# Altium footprint library std-th.PcbLib: 245 footprints (part 15 of 16)
Each footprint in its own frame and in the unit in brackets; x right, y up, seen from the top. Pads: shape width x height; smd on the part's side, far side on the other; paste and mask are expansions set on the pad; w line width, h text height; cw(c..) or ccw(c..) is an arc to the next point about the centre after c.
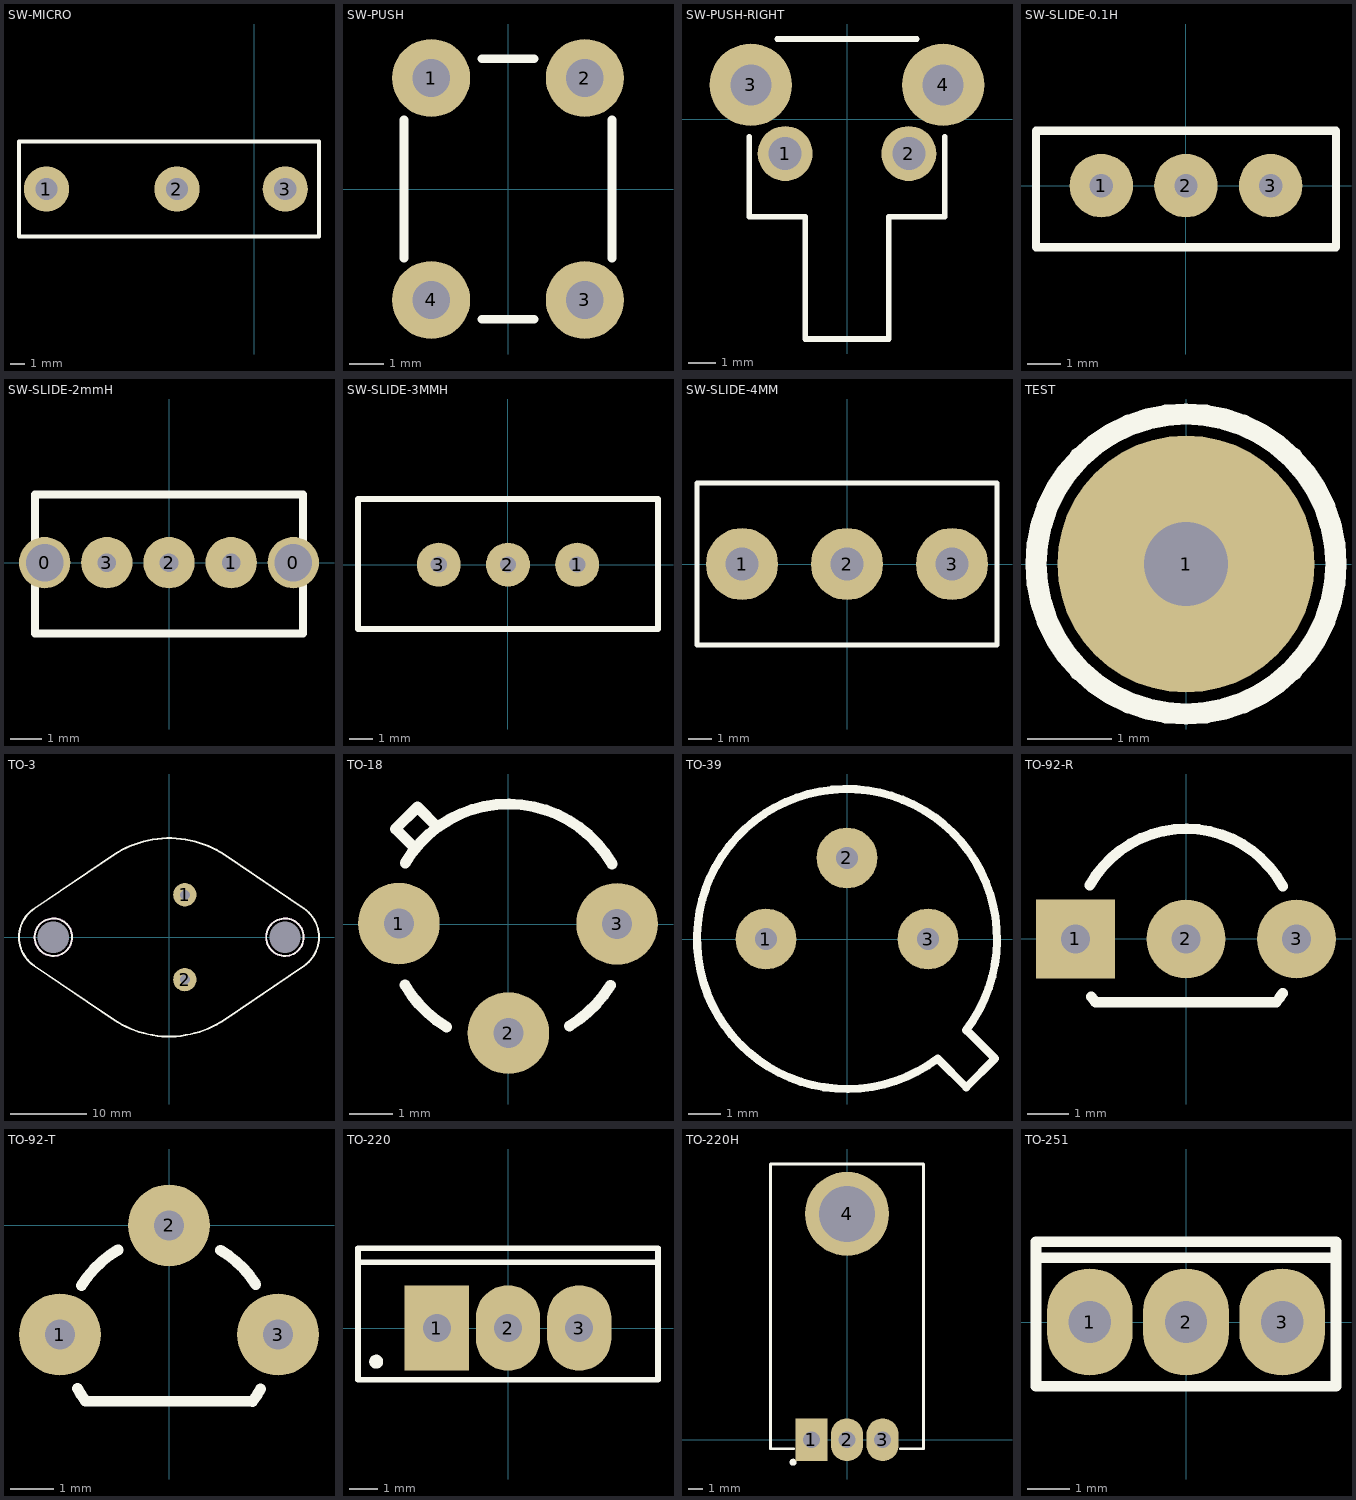
[diagram p14: the footprints below, top view; thin cyan lines are the x and y axes]

## SW-MICRO [mil] "Microswitch, 3 way"
height 472.44
pads (3):
  round 120 hole 59.06: 1(-551.97,500) 2(-205.52,500) 3(81.89,500)
Top Overlay:
  lines w10: -624.8,374.02 171.37,374.02 171.37,625.99 -624.8,625.99 -624.8,374.02
3D body: height 889.76, standoff -145.67, extent -624.8,374.02 171.37,625.99

## SW-PUSH [mm] "Switch, push button, tacticle, 6 x 4 mm"
height 4
pads (4):
  round 2.286 hole 1.1: 1(-2.25,3.25) 2(2.25,3.25) 3(2.25,-3.25) 4(-2.25,-3.25)
Top Overlay:
  lines w0.254: -3.048,-2.032 -3.048,2.032 ; -0.762,-3.81 0.762,-3.81 ; -0.762,3.81 0.762,3.81 ; 3.048,-2.032 3.048,2.032
3D body: height 5.01, standoff -3.51, extent -3.015,-3.871 3.015,3.872

## SW-PUSH-RIGHT [mm] "Push button, right angle"
pads (4):
  round 2 hole 1.2: 1(-2.25,-1.25) 2(2.25,-1.25)
  round 3 hole 1.5: 3(-3.5,1.25) 4(3.5,1.25)
Top Overlay:
  lines w0.203: -3.556,-0.635 -3.556,-3.556 -1.524,-3.556 -1.524,-8.001 1.524,-8.001 1.524,-3.556 3.556,-3.556 3.556,-0.635 ; -2.54,2.921 2.54,2.921
3D body: height 7, standoff -4, extent -3.7,-8.08 3.7,2.92

## SW-SLIDE-0.1H [mm] "Slide Switch, 3 leads, ON-ON, 100 mil pitch"
height 5
pads (3):
  round 1.905 hole 0.7: 1(-2.54,0) 2(0,0) 3(2.54,0)
Top Overlay:
  lines w0.254: -4.499,-1.85 -4.499,1.65 4.5,1.65 4.5,1.65 4.5,-1.85 -4.5,-1.85 ; -4.5,-1.85 -4.499,-1.85
3D body: height 3.5, standoff -2.5, extent -4.499,-4.05 4.5,1.65

## SW-SLIDE-2mmH [mil] "Switch, SPDT, 2 mm pitch"
height 236.22
pads (5):
  round 65 hole 47.24: 0(-157.48,0) 0(157.48,0)
  round 65 hole 23.62: 1(78.74,0) 2(0,0) 3(-78.74,0)
Top Overlay:
  lines w10: -169.49,-90 169.51,-90 169.51,86.51 -169.49,86.51 -169.49,-90
3D body: height 185, standoff -110, extent -169.49,-243.11 169.51,86.51

## SW-SLIDE-3MMH [mm] "Switch, 3 leads, ON-ON, 3 mm pitch"
height 4
pads (3):
  round 1.905 hole 0.7: 1(3,0) 2(0,0) 3(-3,0)
Top Overlay:
  lines w0.254: -6.5,-2.794 6.5,-2.794 6.5,2.85 -6.5,2.85 -6.5,-2.794
3D body: height 6, standoff -2.6, extent -6.5,-9.35 6.5,2.85

## SW-SLIDE-4MM [mil] "Slide switch, 3 leads, 4 mm pitch"
height 521.65
pads (3):
  round 120 hole 55.12: 1(-175,0) 2(0,0) 3(175,0)
Top Overlay:
  lines w8: -250,-135 -250,135 250,135 250,-135 -250,-135
3D body: height 383, standoff -170, extent -216.5,-110 216.5,110

## TEST [mil] "Test Point"
pads (1):
  round 120 hole 39.37: 1(0,0)
Top Overlay:
  circle w10: c0,0 r70

## TO-3 [mm] "TO-3 package"
pads (4):
  round 0 hole 4.1: 0(-15.15,0) 1(15.15,0)
  round 3.048 hole 1.3: 1(2.05,5.55) 2(2.05,-5.55)
Top Overlay:
  circle w0.254: c-15.15,0 r2.45
  circle w0.254: c15.15,0 r2.45
  lines w0.254: -17.675,-3.725 cw(c-15.15,0) -17.675,3.725 -7.294,10.761 cw(c0,-0.257) 7.294,10.761 17.675,3.725 cw(c15.049,0) 17.675,-3.725 7.294,-10.761 cw(c0,0) -7.294,-10.761 -17.675,-3.725
Keep-Out Layer:
  circle w0.254: c-15.15,0 r2.45
  circle w0.254: c15.15,0 r2.45
3D body: height 9.26, standoff -2.64, extent -19.65,-13 19.606,13

## TO-18 [mm] "TO-18 package"
height 15
pads (3):
  round 1.905 hole 0.7: 1(-2.553,0.013) 2(0,-2.54) 3(2.535,0.007)
Top Overlay:
  lines w0.254: -2.412,-1.416 ccw(c0,0) -1.439,-2.399 ; -2.404,1.425 cw(c0,0.013) 2.418,1.4 ; -2.163,1.757 -2.629,2.222 ; -1.65,2.26 -2.121,2.73 ; 1.422,-2.373 ccw(c0,0.013) 2.376,-1.425 ; -2.629,2.222 -2.629,2.222 ; -2.629,2.222 -2.121,2.73 ; -2.121,2.73 -2.121,2.73 ; -2.121,2.73 -2.121,2.73
3D body: height 2.5, standoff -7.41, extent -2.86,-2.834 2.835,2.801

## TO-39 [mm] "TO-39"
height 10
pads (3):
  round 1.905 hole 0.7: 1(-2.54,0) 2(0,2.54) 3(2.54,0)
Top Overlay:
  lines w0.254: 2.842,-3.743 cw(c0,0) 3.73,-2.86 ; 2.866,-3.775 3.737,-4.645 4.635,-3.746 3.739,-2.85
3D body: height 10.6, standoff -7.82, extent -4.7,-4.7 4.687,4.7

## TO-92-R [mm] "TO-92"
height 5
pads (3):
  rect 1.905x1.905 hole 0.7: 1(-2.667,0)
  round 1.905 hole 0.7: 2(0,0) 3(2.667,0)
Top Overlay:
  lines w0.254: -2.324,1.293 cw(c0,0) 2.337,1.27 ; -2.282,-1.394 ccw(c-0.323,0.028) -2.176,-1.53 2.176,-1.53 2.167,-1.522 ; 2.172,-1.526 ccw(c0.323,0.032) 2.338,-1.304
3D body: height 10.33, standoff -7.7, extent -2.888,-1.53 2.852,2.66

## TO-92-T [mm] "TO-92 package"
pads (3):
  round 1.905 hole 0.7: 1(-2.54,-2.54) 2(0,0) 3(2.54,-2.54)
Top Overlay:
  lines w0.203: 1.945,-4.093 1.947,-4.095
  lines w0.254: -2.127,-3.799 ccw(c-0.017,-2.695) -1.945,-4.093 1.945,-4.093 ; -2.033,-1.396 cw(c0,-2.635) -1.181,-0.568 ; 1.198,-0.577 cw(c0,-2.635) 2.019,-1.373 ; 1.947,-4.095 ccw(c0.034,-2.677) 2.132,-3.805
3D body: height 8, standoff -3.02, extent -2.787,-4.091 2.788,0.248

## TO-220 [mil] "TO, Thru-Hole, Vertical, Heatsink Mounted; 3 In-Line Leads; Pitch 2.54 mm"
height 759.84
pads (3):
  rect 90x120 hole 39.37: 1(-100,0)
  oval 90x120 hole 39.37: 2(0,0) 3(100,0)
Top Overlay:
  circle w9.84: c-185.04,-47.24 r4.92
  lines w7.87: -210.63,92.52 210.63,92.52 ; -210.63,-72.83 210.63,-72.83 210.63,112.2 -210.63,112.2 -210.63,-72.83
Mechanical 13:
  lines w3.94: -210.63,-72.83 -210.63,112.2 210.63,112.2 210.63,-72.83 -210.63,-72.83
Mechanical 15:
  lines w3.94: -19.69,0 19.68,0 ; 0,-19.69 0,19.68
3D body: height 748.03, standoff -370.08, extent -204.72,-67.16 204.72,110

## TO-220H [mil] "TO-220AB, 3 leads, 100 mil pitch, horizontal"
height 157.48
pads (4):
  rect 90x120 hole 47.24: 1(-100,0)
  oval 90x120 hole 47.24: 2(0,0) 3(100,0)
  round 236.22 hole 157.48 unplated: 4(0,635)
Top Overlay:
  circle w9.84: c-151.57,-62.99 r4.92
  lines w8: -150,-25 -215,-25 -215,775 215,775 215,-25 150,-25
Mechanical 15:
  lines w3.94: -19.69,0 19.68,0 ; 0,-19.68 0,19.69
3D body: height 165.35, standoff -118.11, extent -199.99,-9.84 200.01,757.49

## TO-251 [mm] "TO-251"
height 10
pads (3):
  oval 2.032x2.54 hole 1: 1(-2.28,0) 2(0,0) 3(2.28,0)
Top Overlay:
  lines w0.254: -3.556,-1.524 3.556,-1.524 3.556,1.524 ; -3.556,-1.524 -3.556,1.524 ; -3.556,-1.524 -3.556,1.524 ; -3.556,1.524 3.556,1.524 ; -3.556,1.524 -3.556,1.905 3.556,1.905 3.556,1.524
3D body: height 9.65, standoff -3.17, extent -3.25,-0.994 3.25,1.306